# Altium footprint library SVP_Shared.PcbLib: 57 footprints (part 1 of 4)
Each footprint in its own frame and in the unit in brackets; x right, y up, seen from the top. Pads: shape width x height; smd on the part's side, far side on the other; paste and mask are expansions set on the pad; w line width, h text height; cw(c..) or ccw(c..) is an arc to the next point about the centre after c.
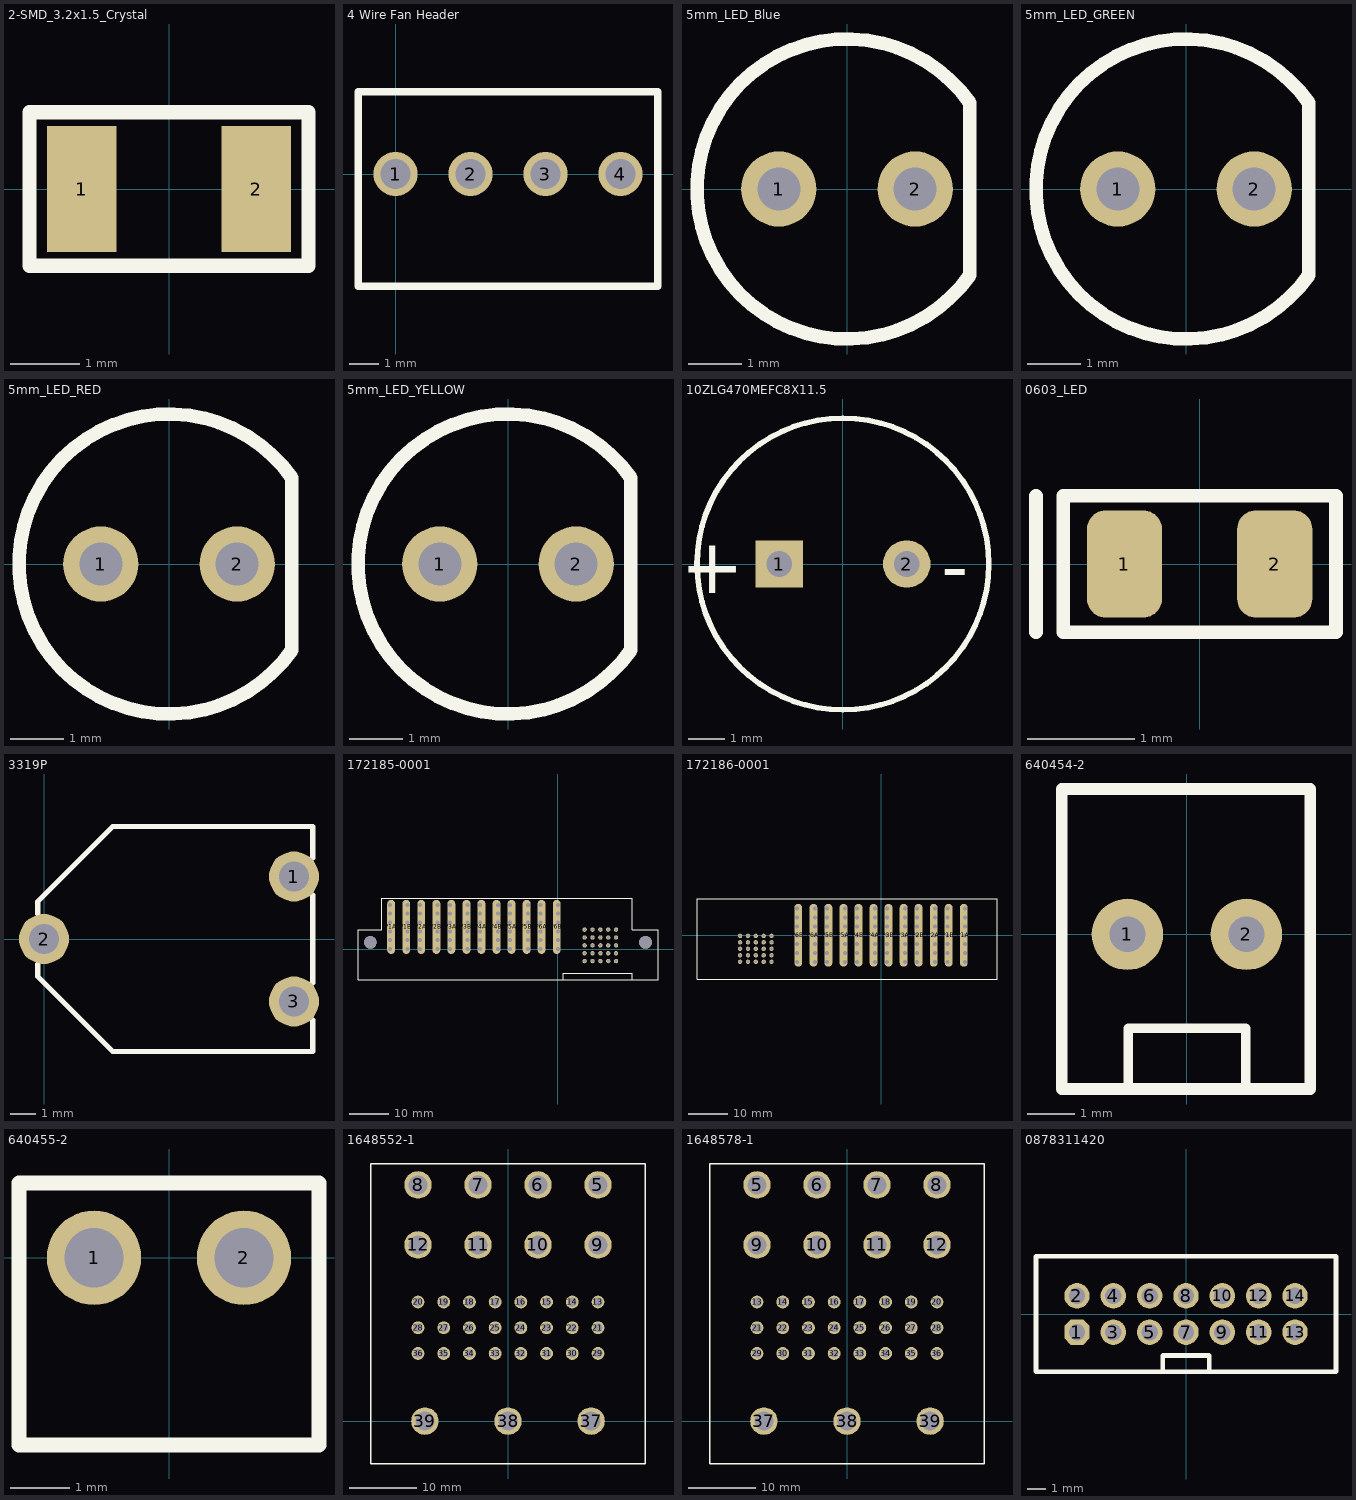
[diagram p0: the footprints below, top view; thin cyan lines are the x and y axes]

## 2-SMD_3.2x1.5_Crystal [mm] "2-SMD, No Lead (DFN, LCC), n 0.126\" L x 0.061\" W (3.20mm x 1.50mm)"
pads (2):
  rect 1x1.8 smd: 1(-1.25,0) 2(1.25,0)
Top Overlay:
  lines w0.203: -2,-1.1 -1.9,-1.1 2,-1.1 2,1.1 -2,1.1 -2,-1.1
3D body "User Library-ABS07.STEP": height 0.92, standoff 0.01, extent -1.61,-0.76 1.61,0.76

## 4 Wire Fan Header [mm] "4 Pin Fan Header"
height 10
pads (4):
  round 1.5 hole 1: 1(0,0) 2(2.54,0) 3(5.08,0) 4(7.62,0)
Top Overlay:
  lines w0.254: -1.27,-3.81 -1.27,0 -1.27,2.794 8.89,2.794 8.89,-3.81 -1.27,-3.81
3D body "User Library-Connector Type-K 4-Pin.step": height 11.15, standoff -3.4, extent -1.185,-3.63 8.785,2.7

## 5mm_LED_Blue [mm]
pads (2):
  round 1.4 hole 0.8: 1(-1.27,0) 2(1.27,0)
Top Overlay:
  lines w0.254: 2.289,-1.603 cw(c0,0) 2.289,1.603 2.289,-1.603
3D body "User Library-LEDd5B.STEP": height 12.31, standoff -2.49, extent -2.98,-3.01 2.44,3.01

## 5mm_LED_GREEN [mm]
height 1.12
pads (2):
  round 1.4 hole 0.8: 1(-1.27,0) 2(1.27,0)
Top Overlay:
  lines w0.254: 2.289,-1.603 cw(c0,0) 2.289,1.603 2.289,-1.603
3D body "LEDd5G.STEP": height 12.31, standoff -2.49, extent -2.98,-3.01 2.44,3.01

## 5mm_LED_RED [mm]
height 1.12
pads (2):
  round 1.4 hole 0.8: 1(-1.27,0) 2(1.27,0)
Top Overlay:
  lines w0.254: 2.289,-1.603 cw(c0,0) 2.289,1.603 2.289,-1.603
3D body "LEDd5R.STEP": height 12.31, standoff -2.49, extent -2.98,-3.01 2.44,3.01

## 5mm_LED_YELLOW [mm]
height 1.12
pads (2):
  round 1.4 hole 0.8: 1(-1.27,0) 2(1.27,0)
Top Overlay:
  lines w0.254: 2.289,-1.603 cw(c0,0) 2.289,1.603 2.289,-1.603
3D body "LEDd5Y.STEP": height 12.31, standoff -2.49, extent -2.98,-3.01 2.44,3.01

## 10ZLG470MEFC8X11.5 [mm]
pads (2):
  rect 1.3x1.3 hole 0.7: 1(-1.75,0)
  round 1.3 hole 0.7: 2(1.75,0)
Top Overlay:
  circle w0.152: c0,0 r4
  text "-" at 2.7,-0.8 h1.52
  text "+" at -2.7,-0.8 h1.52
3D body "User Library-CapAluRadial_D80H115.STEP": height 13, standoff -3, extent -4.25,-4.249 4.25,4.249

## 0603_LED [mm] "0603 LED"
height 0.8
pads (2):
  rrect50% 0.7x1 smd: 1(-0.7,0) 2(0.7,0)
Top Overlay:
  lines w0.127: -1.524,-0.635 -1.524,0.635 ; -1.27,-0.635 -1.27,0.635 1.27,0.635 1.27,-0.635 -1.27,-0.635
Mechanical 15:
  lines w0.1: -1.27,-0.635 1.27,-0.635 1.27,0.635 -1.27,0.635 -1.27,-0.635
3D body "LED 0603 single color.stp": height 0.7, standoff -0.01, extent -0.8,-0.394 0.8,0.394

## 3319P [mm] "0.2W, 1/5W PC Pins Through Hole Trimmer Potentiometer Carbon 1 Turn Top Adjustment"
pads (3):
  round 2 hole 1.2: 1(10,2.5) 2(0,0) 3(10,-2.5)
Top Overlay:
  lines w0.203: -0.25,-1 -0.25,-1.5 2.75,-4.5 10.75,-4.5 10.75,-3.25 ; -0.25,1 -0.25,1.5 2.75,4.5 10.75,4.5 10.75,3.25 ; 10.75,-1.75 10.75,0 10.75,1.75
3D body "3319p.stp": height 6.36, standoff -3.98, extent -0.609,-4.496 10.744,4.496

## 172185-0001 [mm] "EXTreme EnergetiC™ Modular Right-Angle Plug Assembly, 31 Circuits (25 Signal/6 Power) with Solder Tail Mounting"
pads (111):
  round 1.1 hole 0.7: A1(6.79,-3.07) A2(8.79,-3.07) A3(10.79,-3.07) A4(12.79,-3.07) A5(14.79,-3.07) B1(6.79,-1.07) B2(8.79,-1.07) B3(10.79,-1.07) B4(12.79,-1.07) B5(14.79,-1.07) C1(6.79,0.93) C2(8.79,0.93) C3(10.79,0.93) C4(12.79,0.93) C5(14.79,0.93) D1(6.79,2.93) D2(8.79,2.93) D3(10.79,2.93) D4(12.79,2.93) D5(14.79,2.93) E1(6.79,4.93) E2(8.79,4.93) E3(10.79,4.93) E4(12.79,4.93) E5(14.79,4.93)
  round 1.3 hole 1.02: P1A(-42.73,0) P1A(-42.73,2.25) P1A(-42.73,4.5) P1A(-42.73,6.75) P1A(-42.73,9) P1A(-42.73,11.25) P1B(-38.25,0) P1B(-38.25,2.25) P1B(-38.25,4.5) P1B(-38.25,6.75) P1B(-38.25,9) P1B(-38.25,11.25) P2A(-35.08,0) P2A(-35.08,2.25) P2A(-35.08,4.5) P2A(-35.08,6.75) P2A(-35.08,9) P2A(-35.08,11.25) P2B(-30.6,0) P2B(-30.6,2.25) P2B(-30.6,4.5) P2B(-30.6,6.75) P2B(-30.6,9) P2B(-30.6,11.25) P3A(-27.43,0) P3A(-27.43,2.25) P3A(-27.43,4.5) P3A(-27.43,6.75) P3A(-27.43,9) P3A(-27.43,11.25) P3B(-22.95,0) P3B(-22.95,2.25) P3B(-22.95,4.5) P3B(-22.95,6.75) P3B(-22.95,9) P3B(-22.95,11.25) P4A(-19.78,0) P4A(-19.78,2.25) P4A(-19.78,4.5) P4A(-19.78,6.75) P4A(-19.78,9) P4A(-19.78,11.25) P4B(-15.3,0) P4B(-15.3,2.25) P4B(-15.3,4.5) P4B(-15.3,6.75) P4B(-15.3,9) P4B(-15.3,11.25) P5A(-12.13,0) P5A(-12.13,2.25) P5A(-12.13,4.5) P5A(-12.13,6.75) P5A(-12.13,9) P5A(-12.13,11.25) P5B(-7.65,0) P5B(-7.65,2.25) P5B(-7.65,4.5) P5B(-7.65,6.75) P5B(-7.65,9) P5B(-7.65,11.25) P6A(-4.48,0) P6A(-4.48,2.25) P6A(-4.48,4.5) P6A(-4.48,6.75) P6A(-4.48,9) P6A(-4.48,11.25) P6B(0,0) P6B(0,2.25) P6B(0,4.5) P6B(0,6.75) P6B(0,9) P6B(0,11.25)
  oval 2x13.75 all layers, no hole: P1A(-42.415,5.625) P1B(-38.565,5.625) P2A(-34.765,5.625) P2B(-30.915,5.625) P3A(-27.115,5.625) P3B(-23.265,5.625) P4A(-19.465,5.625) P4B(-15.615,5.625) P5A(-11.815,5.625) P5B(-7.965,5.625) P6A(-4.165,5.625) P6B(-0.315,5.625)
  round 3.2 hole 3.2 unplated: ""(-47.7,1.68) ""(22.28,1.68)
Top Overlay:
  lines w0.2: 1.35,-7.825 1.35,-6.125 18.9,-6.125 18.9,-7.825 ; 18.9,12.925 18.9,4.925 25.45,4.925 25.45,-7.825 -50.85,-7.825 -50.85,4.925 -44.8,4.925 -44.8,12.925 18.925,12.925
3D body "CM-172185-0001_RevA_20160801.stp": height 16.92, standoff -4.24, extent -50.75,-21.97 25.35,12.82

## 172186-0001 [mm] "EXTreme EnergetiC™ Modular Vertical Receptacle Assembly, 31 Circuits (25 Signal/6 Power) with Press-Fit Tails"
pads (121):
  round 1.1 hole 0.7: A1(-27.86,-6.75) A2(-29.86,-6.75) A3(-31.86,-6.75) A4(-33.86,-6.75) A5(-35.86,-6.75) B1(-27.86,-5.1) B2(-29.86,-5.1) B3(-31.86,-5.1) B4(-33.86,-5.1) B5(-35.86,-5.1) C1(-27.86,-3.45) C2(-29.86,-3.45) C3(-31.86,-3.45) C4(-33.86,-3.45) C5(-35.86,-3.45) D1(-27.86,-1.8) D2(-29.86,-1.8) D3(-31.86,-1.8) D4(-33.86,-1.8) D5(-35.86,-1.8) E1(-27.86,-0.15) E2(-29.86,-0.15) E3(-31.86,-0.15) E4(-33.86,-0.15) E5(-35.86,-0.15)
  oval 2x16 all layers, no hole: P1A(21.05,0) P1B(17.2,0) P2A(13.4,0) P2B(9.55,0) P3A(5.75,0) P3B(1.9,0) P4A(-1.9,0) P4B(-5.75,0) P5A(-9.55,0) P5B(-13.4,0) P6A(-17.2,0) P6B(-21.05,0)
  round 1.3 hole 1.02: P1A(21.4,-6.75) P1A(21.4,-4.5) P1A(21.4,-2.25) P1A(21.4,0) P1A(21.4,2.25) P1A(21.4,4.5) P1A(21.4,6.75) P1B(16.85,-6.75) P1B(16.85,-4.5) P1B(16.85,-2.25) P1B(16.85,0) P1B(16.85,2.25) P1B(16.85,4.5) P1B(16.85,6.75) P2A(13.75,-6.75) P2A(13.75,-4.5) P2A(13.75,-2.25) P2A(13.75,0) P2A(13.75,2.25) P2A(13.75,4.5) P2A(13.75,6.75) P2B(9.2,-6.75) P2B(9.2,-4.5) P2B(9.2,-2.25) P2B(9.2,0) P2B(9.2,2.25) P2B(9.2,4.5) P2B(9.2,6.75) P3A(6.1,-6.75) P3A(6.1,-4.5) P3A(6.1,-2.25) P3A(6.1,0) P3A(6.1,2.25) P3A(6.1,4.5) P3A(6.1,6.75) P3B(1.55,-6.75) P3B(1.55,-4.5) P3B(1.55,-2.25) P3B(1.55,0) P3B(1.55,2.25) P3B(1.55,4.5) P3B(1.55,6.75) P4A(-1.55,-6.75) P4A(-1.55,-4.5) P4A(-1.55,-2.25) P4A(-1.55,0) P4A(-1.55,2.25) P4A(-1.55,4.5) P4A(-1.55,6.75) P4B(-6.1,-6.75) P4B(-6.1,-4.5) P4B(-6.1,-2.25) P4B(-6.1,0) P4B(-6.1,2.25) P4B(-6.1,4.5) P4B(-6.1,6.75) P5A(-9.2,-6.75) P5A(-9.2,-4.5) P5A(-9.2,-2.25) P5A(-9.2,0) P5A(-9.2,2.25) P5A(-9.2,4.5) P5A(-9.2,6.75) P5B(-13.75,-6.75) P5B(-13.75,-4.5) P5B(-13.75,-2.25) P5B(-13.75,0) P5B(-13.75,2.25) P5B(-13.75,4.5) P5B(-13.75,6.75) P6A(-16.85,-6.75) P6A(-16.85,-4.5) P6A(-16.85,-2.25) P6A(-16.85,0) P6A(-16.85,2.25) P6A(-16.85,4.5) P6A(-16.85,6.75) P6B(-21.4,-6.75) P6B(-21.4,-4.5) P6B(-21.4,-2.25) P6B(-21.4,0) P6B(-21.4,2.25) P6B(-21.4,4.5) P6B(-21.4,6.75)
Top Overlay:
  lines w0.2: -46.825,-11.2 -46.825,9.3 29.5,9.3 29.5,-11.2 -46.825,-11.2
3D body "CM-172186-0001_RevA_20160801.stp": height 14.43, standoff -2.82, extent -46.7,-11.1 29.4,9.2

## 640454-2 [mil]
pads (2):
  round 60 hole 30: 1(-50,0) 2(50,0)
Top Overlay:
  lines w8: -49.21,-129.92 -49.21,-78.74 49.21,-78.74 49.21,-129.92
  lines w10: -105.12,-129.92 103.54,-129.92 103.54,122.05 -105.12,122.05 -105.12,-129.92
3D body "SW3dPS-Molex - 2-Pin Header with Lock (0.100in pitch).STEP": height 420.58, standoff -139.27, extent -100,-128 100,122

## 640455-2 [mm]
pads (2):
  round 1.6 hole 1: 1(-1.27,0) 2(1.27,0)
Top Overlay:
  lines w0.254: -2.54,-3.175 -2.54,1.27 2.54,1.27 2.54,-3.175 -2.54,-3.175
3D body "c-640455-2-y-3d.stp": height 6.49, standoff -3.54, extent -2.54,-10.744 2.54,0.305

## 1648552-1 [mil] "39 (24 + 15 Power) Position Housing for Male Pins Connector Black Panel Mount Drawer"
pads (35):
  round 160 hole 110: 5(525,1378) 6(175,1378) 7(-175,1378) 8(-525,1378) 9(525,1028) 10(175,1028) 11(-175,1028) 12(-525,1028) 37(485,0) 38(0,0) 39(-485,0)
  round 75 hole 50: 13(525,695) 14(375,695) 15(225,695) 16(75,695) 17(-75,695) 18(-225,695) 19(-375,695) 20(-525,695) 21(525,545) 22(375,545) 23(225,545) 24(75,545) 25(-75,545) 26(-225,545) 27(-375,545) 28(-525,545) 29(525,395) 30(375,395) 31(225,395) 32(75,395) 33(-75,395) 34(-225,395) 35(-375,395) 36(-525,395)
Top Overlay:
  lines w8: -800,-250 -800,1500 800,1500 800,-250 -800,-250
3D body "c-1766230-1-b-3d.stp": height 900, standoff -446, extent 56.01,2363.5 669.01,2976.5
3D body "c-1766230-1-b-3d.stp": height 900, standoff -446, extent -668.99,2363.5 -55.99,2976.5
3D body "c-1766230-1-b-3d.stp": height 900, standoff -446, extent -668.99,1638.5 -55.99,2251.5
3D body "c-1766230-1-b-3d.stp": height 900, standoff -446, extent 56.01,1638.5 669.01,2251.5
3D body "c-1766245-1-d-3d.stp": height 902, standoff -234.5, extent -578.75,-93.75 -391.25,93.75
3D body "c-1766245-1-d-3d.stp": height 902, standoff -234.5, extent -93.75,-93.75 93.75,93.75
3D body "c-1766245-1-d-3d.stp": height 902, standoff -234.5, extent 391.25,-93.75 578.75,93.75
3D body "c-1650283-1-g-3d.stp": height 802, standoff -187, extent -575.75,344.25 -474.25,445.75
3D body "c-1650283-1-g-3d.stp": height 802, standoff -187, extent -575.75,494.25 -474.25,595.75
3D body "c-1650283-1-g-3d.stp": height 802, standoff -187, extent -575.75,644.25 -474.25,745.75
3D body "c-1650283-1-g-3d.stp": height 802, standoff -187, extent -425.75,344.25 -324.25,445.75
3D body "c-1650283-1-g-3d.stp": height 802, standoff -187, extent -425.75,494.25 -324.25,595.75
3D body "c-1650283-1-g-3d.stp": height 802, standoff -187, extent -425.75,644.25 -324.25,745.75
3D body "c-1650283-1-g-3d.stp": height 802, standoff -187, extent -275.75,344.25 -174.25,445.75
3D body "c-1650283-1-g-3d.stp": height 802, standoff -187, extent -275.75,494.25 -174.25,595.75
3D body "c-1650283-1-g-3d.stp": height 802, standoff -187, extent -275.75,644.25 -174.25,745.75
3D body "c-1650283-1-g-3d.stp": height 802, standoff -187, extent -125.75,344.25 -24.25,445.75
3D body "c-1650283-1-g-3d.stp": height 802, standoff -187, extent -125.75,494.25 -24.25,595.75
3D body "c-1650283-1-g-3d.stp": height 802, standoff -187, extent -125.75,644.25 -24.25,745.75
3D body "c-1650283-1-g-3d.stp": height 802, standoff -187, extent 24.25,344.25 125.75,445.75
3D body "c-1650283-1-g-3d.stp": height 802, standoff -187, extent 24.25,494.25 125.75,595.75
3D body "c-1650283-1-g-3d.stp": height 802, standoff -187, extent 24.25,644.25 125.75,745.75
3D body "c-1650283-1-g-3d.stp": height 802, standoff -187, extent 174.25,344.25 275.75,445.75
3D body "c-1650283-1-g-3d.stp": height 802, standoff -187, extent 174.25,494.25 275.75,595.75
3D body "c-1650283-1-g-3d.stp": height 802, standoff -187, extent 174.25,644.25 275.75,745.75
3D body "c-1650283-1-g-3d.stp": height 802, standoff -187, extent 324.25,344.25 425.75,445.75
3D body "c-1650283-1-g-3d.stp": height 802, standoff -187, extent 324.25,494.25 425.75,595.75
3D body "c-1650283-1-g-3d.stp": height 802, standoff -187, extent 324.25,644.25 425.75,745.75
3D body "c-1650283-1-g-3d.stp": height 802, standoff -187, extent 474.25,344.25 575.75,445.75
3D body "c-1650283-1-g-3d.stp": height 802, standoff -187, extent 474.25,494.25 575.75,595.75
3D body "c-1650283-1-g-3d.stp": height 802, standoff -187, extent 474.25,644.25 575.75,745.75
3D body "c-1766245-1-d-3d.stp": height 902, standoff -234.5, extent 431.25,934.25 618.75,1121.75
3D body "c-1766245-1-d-3d.stp": height 902, standoff -234.5, extent 81.25,934.25 268.75,1121.75
3D body "c-1766245-1-d-3d.stp": height 902, standoff -234.5, extent -268.75,934.25 -81.25,1121.75
3D body "c-1766245-1-d-3d.stp": height 902, standoff -234.5, extent -618.75,934.25 -431.25,1121.75
3D body "c-1766245-1-d-3d.stp": height 902, standoff -234.5, extent -618.75,1284.25 -431.25,1471.75
3D body "c-1766245-1-d-3d.stp": height 902, standoff -234.5, extent -268.75,1284.25 -81.25,1471.75
3D body "c-1766245-1-d-3d.stp": height 902, standoff -234.5, extent 81.25,1284.25 268.75,1471.75
3D body "c-1766245-1-d-3d.stp": height 902, standoff -234.5, extent 431.25,1284.25 618.75,1471.75
3D body "c-1648552-01-a-3d.stp": height 980.5, standoff -119.5, extent -799.99,-689.49 800.01,3555.51

## 1648578-1 [mil] "39 Position Housing for Female Sockets Connector Black Panel Mount Drawer"
pads (35):
  round 160 hole 110: 5(-525,1378) 6(-175,1378) 7(175,1378) 8(525,1378) 9(-525,1028) 10(-175,1028) 11(175,1028) 12(525,1028) 37(-485,0) 38(0,0) 39(485,0)
  round 75 hole 50: 13(-525,695) 14(-375,695) 15(-225,695) 16(-75,695) 17(75,695) 18(225,695) 19(375,695) 20(525,695) 21(-525,545) 22(-375,545) 23(-225,545) 24(-75,545) 25(75,545) 26(225,545) 27(375,545) 28(525,545) 29(-525,395) 30(-375,395) 31(-225,395) 32(-75,395) 33(75,395) 34(225,395) 35(375,395) 36(525,395)
Top Overlay:
  lines w8: -800,-250 800,-250 800,1500 -800,1500 -800,-250
3D body "c-1648382-1-c-3d.stp": height 804.5, standoff -184.5, extent 474.26,344.25 575.75,445.75
3D body "c-1648382-1-c-3d.stp": height 804.5, standoff -184.5, extent 474.26,494.25 575.76,595.75
3D body "c-1648382-1-c-3d.stp": height 804.5, standoff -184.5, extent 474.26,644.25 575.75,745.75
3D body "c-1648382-1-c-3d.stp": height 804.5, standoff -184.5, extent 324.26,344.25 425.75,445.75
3D body "c-1648382-1-c-3d.stp": height 804.5, standoff -184.5, extent 324.26,494.25 425.76,595.75
3D body "c-1648382-1-c-3d.stp": height 804.5, standoff -184.5, extent 324.26,644.25 425.75,745.75
3D body "c-1648382-1-c-3d.stp": height 804.5, standoff -184.5, extent 174.26,344.25 275.75,445.75
3D body "c-1648382-1-c-3d.stp": height 804.5, standoff -184.5, extent 174.26,494.25 275.76,595.75
3D body "c-1648382-1-c-3d.stp": height 804.5, standoff -184.5, extent 174.26,644.25 275.75,745.75
3D body "c-1648382-1-c-3d.stp": height 804.5, standoff -184.5, extent 24.26,344.25 125.75,445.75
3D body "c-1648382-1-c-3d.stp": height 804.5, standoff -184.5, extent 24.26,494.25 125.76,595.75
3D body "c-1648382-1-c-3d.stp": height 804.5, standoff -184.5, extent 24.26,644.25 125.75,745.75
3D body "c-1648382-1-c-3d.stp": height 804.5, standoff -184.5, extent -125.74,344.25 -24.25,445.75
3D body "c-1648382-1-c-3d.stp": height 804.5, standoff -184.5, extent -125.74,494.25 -24.24,595.75
3D body "c-1648382-1-c-3d.stp": height 804.5, standoff -184.5, extent -125.74,644.25 -24.25,745.75
3D body "c-1648382-1-c-3d.stp": height 804.5, standoff -184.5, extent -275.74,344.25 -174.25,445.75
3D body "c-1648382-1-c-3d.stp": height 804.5, standoff -184.5, extent -275.74,494.25 -174.24,595.75
3D body "c-1648382-1-c-3d.stp": height 804.5, standoff -184.5, extent -275.74,644.25 -174.25,745.75
3D body "c-1648382-1-c-3d.stp": height 804.5, standoff -184.5, extent -425.74,344.25 -324.25,445.75
3D body "c-1648382-1-c-3d.stp": height 804.5, standoff -184.5, extent -425.74,494.25 -324.24,595.75
3D body "c-1648382-1-c-3d.stp": height 804.5, standoff -184.5, extent -425.74,644.25 -324.25,745.75
3D body "c-1648382-1-c-3d.stp": height 804.5, standoff -184.5, extent -575.74,344.25 -474.25,445.75
3D body "c-1648382-1-c-3d.stp": height 804.5, standoff -184.5, extent -575.74,494.25 -474.24,595.75
3D body "c-1648382-1-c-3d.stp": height 804.5, standoff -184.5, extent -575.74,644.25 -474.25,745.75
3D body "c-6648374-1-a-3d.stp": height 792.5, standoff -236.5, extent 391.26,-93.75 578.76,93.75
3D body "c-6648374-1-a-3d.stp": height 792.5, standoff -236.5, extent -93.74,-93.75 93.76,93.75
3D body "c-6648374-1-a-3d.stp": height 792.5, standoff -236.5, extent -578.74,-93.75 -391.24,93.75
3D body "c-6648374-1-a-3d.stp": height 792.5, standoff -236.5, extent 431.26,934.25 618.76,1121.75
3D body "c-6648374-1-a-3d.stp": height 792.5, standoff -236.5, extent 431.26,1284.25 618.76,1471.75
3D body "c-6648374-1-a-3d.stp": height 792.5, standoff -236.5, extent 81.26,934.25 268.76,1121.75
3D body "c-6648374-1-a-3d.stp": height 792.5, standoff -236.5, extent 81.26,1284.25 268.76,1471.75
3D body "c-6648374-1-a-3d.stp": height 792.5, standoff -236.5, extent -268.74,934.25 -81.24,1121.75
3D body "c-6648374-1-a-3d.stp": height 792.5, standoff -236.5, extent -268.74,1284.25 -81.24,1471.75
3D body "c-6648374-1-a-3d.stp": height 792.5, standoff -236.5, extent -618.74,1284.25 -431.24,1471.75
3D body "c-6648374-1-a-3d.stp": height 792.5, standoff -236.5, extent -618.74,934.25 -431.24,1121.75
3D body "c-1648578-01-a-3d.stp": height 880.5, standoff -219.5, extent -799.99,-687.49 800.01,3557.51
3D body "c-6648416-1-a-3d.stp": height 800, standoff -491, extent 56,1638.5 669,2251.5
3D body "c-6648416-1-a-3d.stp": height 800, standoff -491, extent -669,1638.5 -56,2251.5
3D body "c-6648416-1-a-3d.stp": height 800, standoff -491, extent -669,2363.5 -56,2976.5
3D body "c-6648416-1-a-3d.stp": height 800, standoff -491, extent 56,2363.5 669,2976.5

## 0878311420 [mm] "14 Positions Header, Shrouded Connector 0.079\" (2.00mm) Through Hole Gold"
pads (14):
  oct 1.4x1.4 hole 0.9: 1(-6,-1)
  round 1.4 hole 0.9: 2(-6,1) 3(-4,-1) 4(-4,1) 5(-2,-1) 6(-2,1) 7(0,-1) 8(0,1) 9(2,-1) 10(2,1) 11(4,-1) 12(4,1) 13(6,-1) 14(6,1)
Top Overlay:
  lines w0.254: -1.27,-3.175 -1.27,-2.286 0,-2.286 1.27,-2.286 1.27,-3.175 ; -8.255,-3.175 8.255,-3.175 8.255,3.175 -8.255,3.175 -8.255,-3.175
3D body "878311420.stp": height 6.41, standoff -2.49, extent -8.325,-3.125 8.325,3.175